# Altium footprint library ST封装.PcbLib: 1336 footprints (part 44 of 109)
Each footprint in its own frame and in the unit in brackets; x right, y up, seen from the top. Pads: shape width x height; smd on the part's side, far side on the other; paste and mask are expansions set on the pad; w line width, h text height; cw(c..) or ccw(c..) is an arc to the next point about the centre after c.
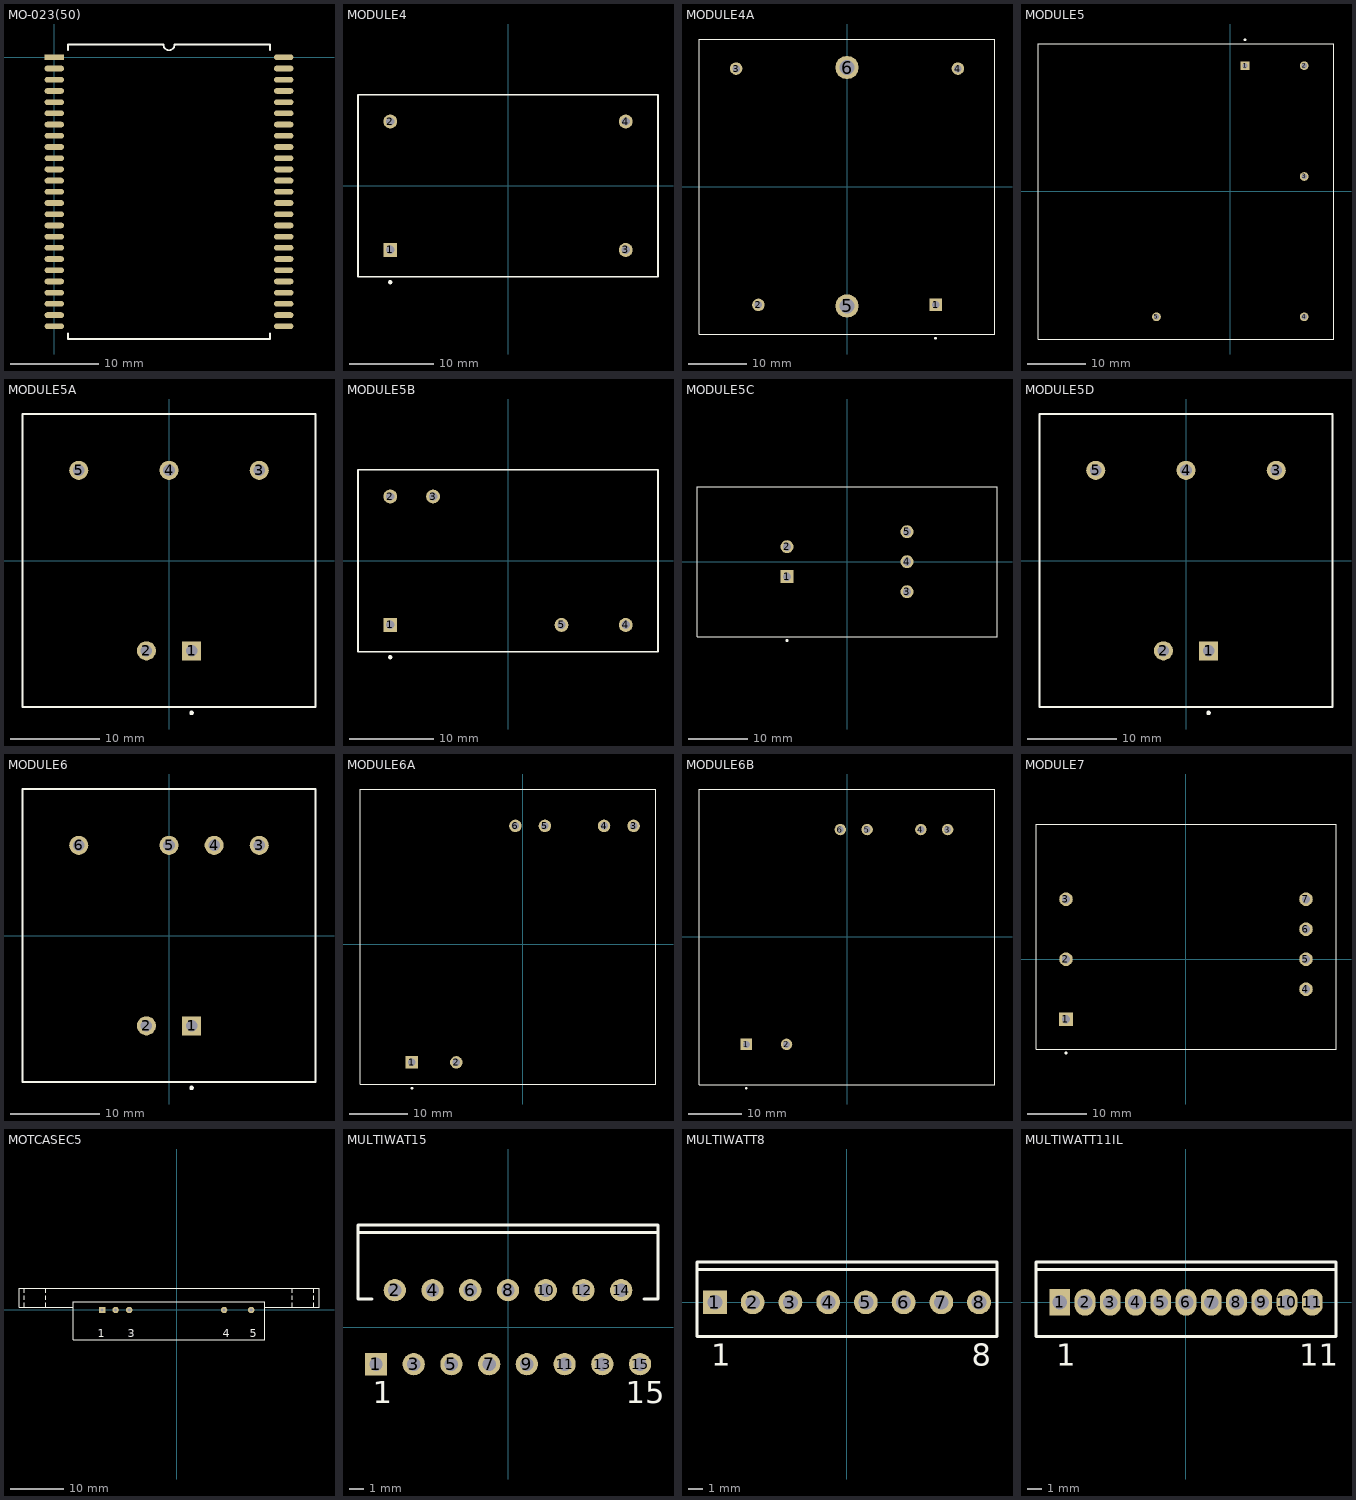
[diagram p43: the footprints below, top view; thin cyan lines are the x and y axes]

## MO-023(50) [mm]
pads (50):
  rect 2.2x0.65 smd: 1(0,0)
  oval 2.2x0.65 smd: 2(0,-1.27) 3(0,-2.54) 4(0,-3.81) 5(0,-5.08) 6(0,-6.35) 7(0,-7.62) 8(0,-8.89) 9(0,-10.16) 10(0,-11.43) 11(0,-12.7) 12(0,-13.97) 13(0,-15.24) 14(0,-16.51) 15(0,-17.78) 16(0,-19.05) 17(0,-20.32) 18(0,-21.59) 19(0,-22.86) 20(0,-24.13) 21(0,-25.4) 22(0,-26.67) 23(0,-27.94) 24(0,-29.21) 25(0,-30.48) 26(26,-30.48) 27(26,-29.21) 28(26,-27.94) 29(26,-26.67) 30(26,-25.4) 31(26,-24.13) 32(26,-22.86) 33(26,-21.59) 34(26,-20.32) 35(26,-19.05) 36(26,-17.78) 37(26,-16.51) 38(26,-15.24) 39(26,-13.97) 40(26,-12.7) 41(26,-11.43) 42(26,-10.16) 43(26,-8.89) 44(26,-7.62) 45(26,-6.35) 46(26,-5.08) 47(26,-3.81) 48(26,-2.54) 49(26,-1.27) 50(26,0)
Top Overlay:
  lines w0.2: 1.57,-31.305 1.57,-31.92 24.43,-31.92 24.43,-31.305 ; 1.57,0.825 1.57,1.44 12.365,1.44 ccw(c13,1.44) 13.635,1.44 24.43,1.44 24.43,0.825

## MODULE4 [mm] "DIP; 4 Round Pins; Row Space 27.94 mm; Pitch 15.24 mm"
height 14
pads (4):
  rect 1.65x1.65 hole 1: 1(-13.97,-7.62)
  round 1.65 hole 1: 2(-13.97,7.62) 3(13.97,-7.62) 4(13.97,7.62)
Top Overlay:
  circle w0.25: c-13.97,-11.45 r0.125
  lines w0.2: -17.8,-10.8 -17.8,10.8 17.8,10.8 17.8,-10.8 -17.8,-10.8

## MODULE4A [mm] "DIP; 4 Round Pins; Row Space 40.64 mm; Pitch 3.81 mm"
height 12.5
pads (6):
  rect 2.15x2.15 hole 1.3: 1(15.24,-20.32)
  round 2.15 hole 1.3: 2(-15.24,-20.32) 3(-19.05,20.32) 4(19.05,20.32)
  round 4 hole 2.5: 5(0,-20.5) 6(0,20.5)
Top Overlay:
  circle w0.25: c15.24,-26.05 r0.125
  lines w0.2: -25.4,-25.4 25.4,-25.4 25.4,25.4 -25.4,25.4 -25.4,-25.4

## MODULE5 [mm] "DIP; 5 Rectangular Pins; Row Space 43.18 mm; Pitch 5.08 mm"
height 14.7
pads (5):
  rect 1.5x1.5 hole 0.9: 1(2.54,21.59)
  round 1.5 hole 0.9: 2(12.7,21.59) 3(12.7,2.54) 4(12.7,-21.59) 5(-12.7,-21.59)
Top Overlay:
  circle w0.25: c2.54,26.05 r0.125
  lines w0.2: -33.02,-25.4 -33.02,25.4 17.78,25.4 17.78,-25.4 -33.02,-25.4

## MODULE5A [mm] "DIP; 5 Round Pins; Row Space 20.32 mm; Pitch 2.54 mm"
height 12.7
pads (5):
  rect 2.15x2.15 hole 1.3: 1(2.54,-10.16)
  round 2.15 hole 1.3: 2(-2.54,-10.16) 3(10.16,10.16) 4(0,10.16) 5(-10.16,10.16)
Top Overlay:
  circle w0.25: c2.54,-17.15 r0.125
  lines w0.2: -16.5,-16.5 16.5,-16.5 16.5,16.5 -16.5,16.5 -16.5,-16.5

## MODULE5B [mm] "DIP; 5 Round Pins; Row Space 15.24 mm; Pitch 2.54 mm"
height 14
pads (5):
  rect 1.65x1.65 hole 1: 1(-13.97,-7.62)
  round 1.65 hole 1: 2(-13.97,7.62) 3(-8.89,7.62) 4(13.97,-7.62) 5(6.35,-7.62)
Top Overlay:
  circle w0.25: c-13.97,-11.45 r0.125
  lines w0.2: -17.8,-10.8 -17.8,10.8 17.8,10.8 17.8,-10.8 -17.8,-10.8

## MODULE5C [mm] "DIP; 5 Round Pins; Row Space 20.32 mm; Pitch 2.54 mm"
height 12
pads (5):
  rect 2.2x2.2 hole 1.4: 1(-10.16,-2.54)
  round 2.2 hole 1.4: 2(-10.16,2.54) 3(10.16,-5.08) 4(10.16,0) 5(10.16,5.08)
Top Overlay:
  circle w0.25: c-10.16,-13.35 r0.125
  lines w0.2: -25.4,-12.7 25.4,-12.7 25.4,12.7 -25.4,12.7 -25.4,-12.7

## MODULE5D [mm] "DIP; 5 Round Pins; Row Space 20.32 mm; Pitch 2.54 mm"
height 16.5
pads (5):
  rect 2.15x2.15 hole 1.3: 1(2.54,-10.16)
  round 2.15 hole 1.3: 2(-2.54,-10.16) 3(10.16,10.16) 4(0,10.16) 5(-10.16,10.16)
Top Overlay:
  circle w0.25: c2.54,-17.15 r0.125
  lines w0.2: -16.5,-16.5 -16.5,16.5 16.5,16.5 16.5,-16.5 -16.5,-16.5

## MODULE6 [mm] "DIP; 6 Round Pins; Row Space 20.32 mm; Pitch 2.54 mm"
height 16.5
pads (6):
  rect 2.15x2.15 hole 1.3: 1(2.54,-10.16)
  round 2.15 hole 1.3: 2(-2.54,-10.16) 3(10.16,10.16) 4(5.08,10.16) 5(0,10.16) 6(-10.16,10.16)
Top Overlay:
  circle w0.25: c2.54,-17.15 r0.125
  lines w0.2: -16.5,-16.5 -16.5,16.5 16.5,16.5 16.5,-16.5 -16.5,-16.5

## MODULE6A [mm] "DIP; 6 Round Pins; Row Space 40.64 mm; Pitch 2.54 mm"
height 18
pads (6):
  rect 2.15x2.15 hole 1.3: 1(-19.05,-20.32)
  round 2.15 hole 1.3: 2(-11.43,-20.32) 3(19.05,20.32) 4(13.97,20.32) 5(3.81,20.32) 6(-1.27,20.32)
Top Overlay:
  circle w0.25: c-19.05,-24.78 r0.125
  lines w0.2: -27.94,-24.13 -27.94,26.67 22.86,26.67 22.86,-24.13 -27.94,-24.13

## MODULE6B [mm] "DIP; 6 Round Pins; Row Space 40.64 mm; Pitch 2.54 mm"
height 18
pads (6):
  rect 2.15x2.15 hole 1.3: 1(-19.05,-20.32)
  round 2.15 hole 1.3: 2(-11.43,-20.32) 3(19.05,20.32) 4(13.97,20.32) 5(3.81,20.32) 6(-1.27,20.32)
Top Overlay:
  circle w0.25: c-19.05,-28.65 r0.125
  lines w0.2: -28,-28 28,-28 28,28 -28,28 -28,-28

## MODULE7 [mm] "DIP; 7 Round Pins; Row Space 40.64 mm; Pitch 5.08 mm"
height 19
pads (7):
  rect 2.3x2.3 hole 1.4: 1(-20.32,-10.16)
  round 2.3 hole 1.4: 2(-20.32,0) 3(-20.32,10.16) 4(20.32,-5.08) 5(20.32,0) 6(20.32,5.08) 7(20.32,10.16)
Top Overlay:
  circle w0.25: c-20.32,-15.89 r0.125
  lines w0.2: -25.4,-15.24 25.4,-15.24 25.4,22.86 -25.4,22.86 -25.4,-15.24

## MOTCASEC5 [mm] "Rectangular Flange Mount, Thru-Hole; 5 Leads; Pitch 2.54 mm"
height 19.6
pads (5):
  rect 1.2x1.2 hole 0.6: 1(-13.97,0)
  round 1.2 hole 0.6: 2(-11.43,0) 3(-8.89,0) 4(8.89,0) 5(13.97,0)
Top Overlay:
  lines w0.2: -28.53,0.55 -28.53,1.35 ; -28.53,1.9 -28.53,2.7 ; -28.53,3.25 -28.53,4.05 ; -24.53,0.55 -24.53,1.35 ; -24.53,1.9 -24.53,2.7 ; -24.53,3.25 -24.53,4.05 ; -19.38,0.55 -29.53,0.55 -29.53,4.05 26.67,4.05 26.67,0.55 16.52,0.55 ; 21.67,0.55 21.67,1.35 ; 21.67,1.9 21.67,2.7 ; 21.67,3.25 21.67,4.05 ; 25.67,0.55 25.67,1.35 ; 25.67,1.9 25.67,2.7 ; 25.67,3.25 25.67,4.05 ; -19.38,-5.55 16.52,-5.55 16.52,1.55 -19.38,1.55 -19.38,-5.55
  text "1" at -14.732,-5.08 h1.5
  text "3" at -9.144,-5.08 h1.5
  text "4" at 8.636,-5.08 h1.5
  text "5" at 13.716,-5.08 h1.5

## MULTIWAT15 [mm] "TO, Thru-Hole, Vertical, Heatsink Mounted; 15 Bent Staggered Leads; Pitch 1.27 mm"
height 21
pads (15):
  rect 1.5x1.5 hole 0.9: 1(-8.89,-2.49)
  round 1.5 hole 0.9: 2(-7.62,2.49) 3(-6.35,-2.49) 4(-5.08,2.49) 5(-3.81,-2.49) 6(-2.54,2.49) 7(-1.27,-2.49) 8(0,2.49) 9(1.27,-2.49) 10(2.54,2.49) 11(3.81,-2.49) 12(5.08,2.49) 13(6.35,-2.49) 14(7.62,2.49) 15(8.89,-2.49)
Top Overlay:
  lines w0.2: -10.1,6.39 10.1,6.39 ; -9.144,1.89 -10.1,1.89 -10.1,6.89 10.1,6.89 10.1,1.89 9.144,1.89
  text "15" at 7.94,-5.115 h1.5
  text "1" at -9.12,-5.115 h1.5

## MULTIWATT8 [mm] "TO, Thru-Hole, Vertical, Heatsink Mounted; 8 In-Line Leads; Pitch 2.54 mm"
height 20.5
pads (8):
  rect 1.6x1.6 hole 1: 1(-8.89,0)
  round 1.6 hole 1: 2(-6.35,0) 3(-3.81,0) 4(-1.27,0) 5(1.27,0) 6(3.81,0) 7(6.35,0) 8(8.89,0)
Top Overlay:
  lines w0.2: -10.1,2.2 10.1,2.2 ; -10.1,-2.3 10.1,-2.3 10.1,2.7 -10.1,2.7 -10.1,-2.3
  text "1" at -9.14,-4.275 h1.5
  text "8" at 8.39,-4.275 h1.5

## MULTIWATT11IL [mm] "TO, Thru-Hole, Vertical, Heatsink Mounted; 11 In-Line Leads; Pitch 1.70 mm"
height 17.8
pads (11):
  rect 1.4x1.8 hole 1: 1(-8.5,0)
  oval 1.4x1.8 hole 1: 2(-6.8,0) 3(-5.1,0) 4(-3.4,0) 5(-1.7,0) 6(0,0) 7(1.7,0) 8(3.4,0) 9(5.1,0) 10(6.8,0) 11(8.5,0)
Top Overlay:
  lines w0.2: -10.1,2.2 10.1,2.2 ; -10.1,-2.3 -10.1,2.7 10.1,2.7 10.1,-2.3 -10.1,-2.3
  text "11" at 7.625,-4.275 h1.5
  text "1" at -8.75,-4.275 h1.5